# Altium footprint library MMT_MCUs_ICs.PcbLib: 44 footprints (part 3 of 3)
Each footprint in its own frame and in the unit in brackets; x right, y up, seen from the top. Pads: shape width x height; smd on the part's side, far side on the other; paste and mask are expansions set on the pad; w line width, h text height; cw(c..) or ccw(c..) is an arc to the next point about the centre after c.
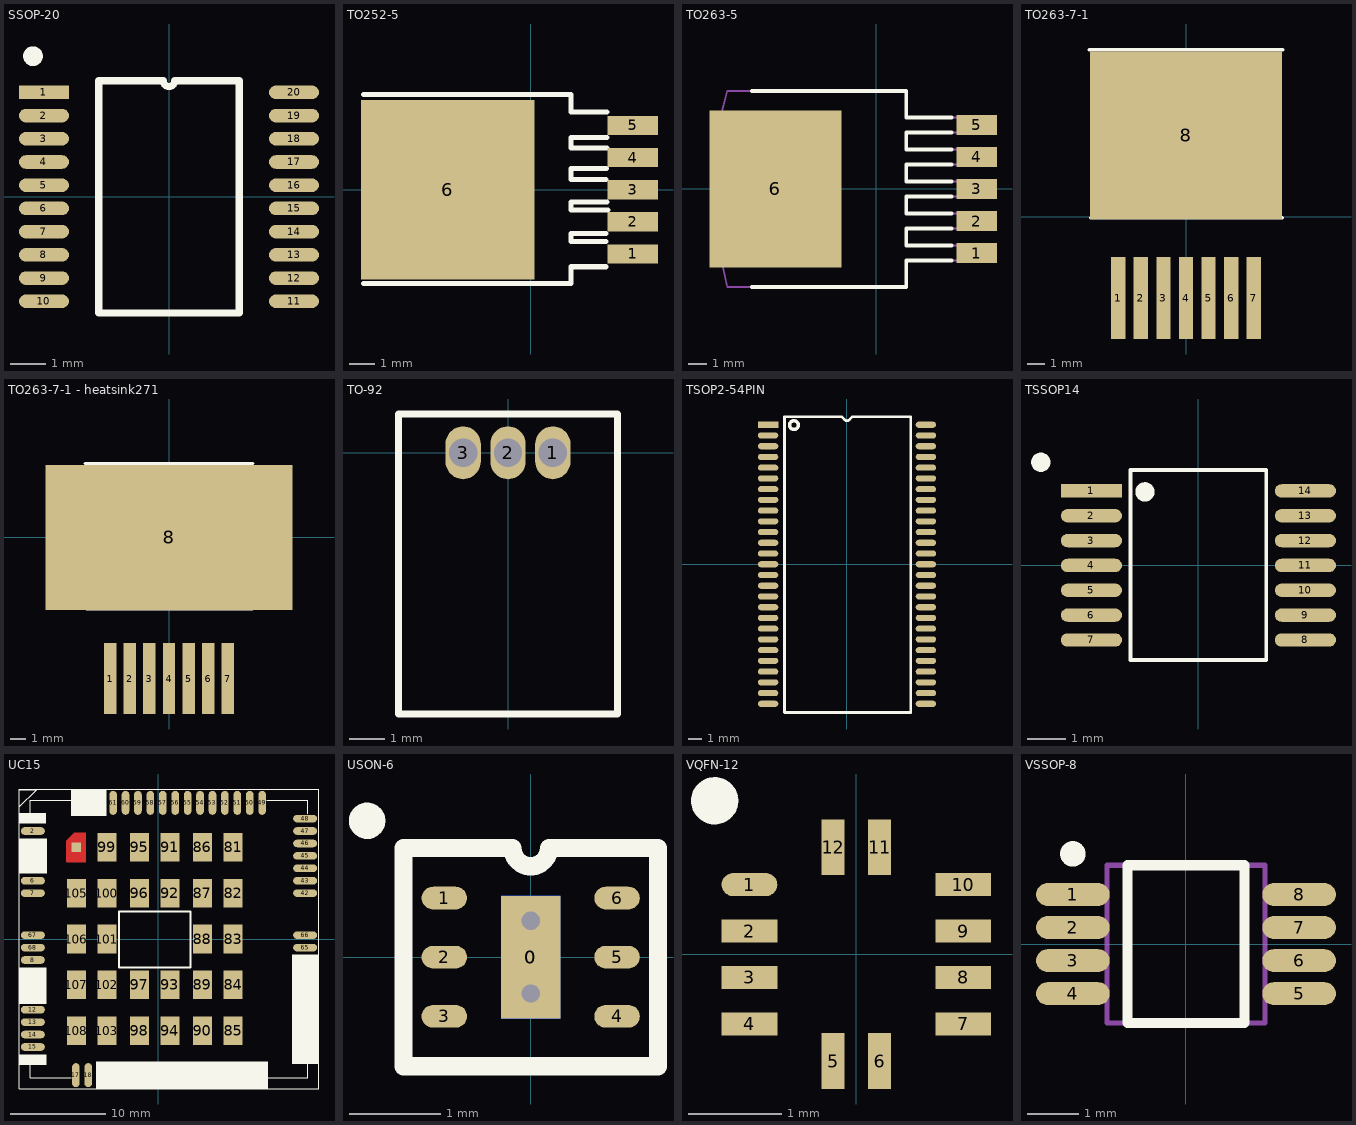
[diagram p2: the footprints below, top view; thin cyan lines are the x and y axes]

## SSOP-20 [mm]
pads (20):
  rect 1.4x0.38 smd: 1(-3.5,2.925)
  oval 1.4x0.38 smd: 2(-3.5,2.275) 3(-3.5,1.625) 4(-3.5,0.975) 5(-3.5,0.325) 6(-3.5,-0.325) 7(-3.5,-0.975) 8(-3.5,-1.625) 9(-3.5,-2.275) 10(-3.5,-2.925) 11(3.5,-2.925) 12(3.5,-2.275) 13(3.5,-1.625) 14(3.5,-0.975) 15(3.5,-0.325) 16(3.5,0.325) 17(3.5,0.975) 18(3.5,1.625) 19(3.5,2.275) 20(3.5,2.925)
Top Overlay:
  circle w0.3: c-3.81,3.937 r0.125
  lines w0.2: -1.965,-3.25 -1.965,3.25 -0.162,3.25 ccw(c0,3.25) 0.162,3.25 1.965,3.25 1.965,-3.25 -1.965,-3.25
3D body "User Library-SSOP 20 PIN-1 (1).step": height 1.98, standoff -0.01, extent -3.95,-3.665 3.95,3.665

## TO252-5 [mm]
pads (6):
  rect 2x0.76 smd: 1(4.035,-2.54) 2(4.035,-1.27) 3(4.035,0) 4(4.035,1.27) 5(4.035,2.54)
  rect 6.85x7.1 smd: 6(-3.277,0)
Top Overlay:
  lines w0.2: -6.6,-3.708 1.6,-3.708 1.6,-3.048 2.972,-3.048 ; -6.6,3.759 1.6,3.759 1.6,3.073 3.023,3.073 ; 2.972,-2.057 1.6,-2.057 1.6,-1.727 2.972,-1.727 ; 2.972,0.406 1.6,0.406 1.6,0.838 2.997,0.838 ; 3.023,-0.483 1.6,-0.483 1.6,-0.813 3.048,-0.813 ; 3.023,1.651 1.6,1.651 1.6,2.057 3.023,2.057
3D body "User Library-DPAK-5-1.STEP": height 2.4, standoff -0.01, extent -6.274,-3.299 4.592,3.401

## TO263-5 [mm]
pads (6):
  rect 2.16x1.07 smd: 1(5.338,-3.4) 2(5.338,-1.7) 3(5.338,0.005) 4(5.338,1.7) 5(5.338,3.4)
  rect 6.99x8.33 smd: 6(-5.338,0)
Top Overlay:
  lines w0.2: -6.6,-5.2 1.6,-5.2 1.6,-3.8 4,-3.8 ; -6.6,5.2 1.6,5.2 1.6,3.8 4,3.8 ; 4,-3 1.6,-3 1.6,-2.1 4,-2.1 ; 4,-1.3 1.6,-1.3 1.6,-0.4 4,-0.4 ; 4,0.4 1.6,0.4 1.6,1.3 4,1.3 ; 4,2.1 1.6,2.1 1.6,3 4,3
Mechanical 1:
  lines w0.1: -8.3,-3.3 -7.9,-5.2 1.6,-5.2 1.6,-3.8 6,-3.8 6,-3 1.6,-3 1.6,-2.1 6,-2.1 6,-1.3 1.6,-1.3 1.6,-0.4 6,-0.4 6,0.4 1.6,0.4 1.6,1.3 6,1.3 6,2.1 1.6,2.1 1.6,3 6,3 6,3.8 1.6,3.8 1.6,5.2 -7.9,5.2 -8.3,3.6 -8.3,-3.3
3D body "3d.stp": height 4.57, standoff -0.15, extent -8.039,-5.08 6.261,5.08

## TO263-7-1 [mm]
pads (8):
  rect 0.8x4.6 smd: 1(-3.81,-4.575) 2(-2.54,-4.575) 3(-1.27,-4.575) 4(0,-4.575) 5(1.27,-4.575) 6(2.54,-4.575) 7(3.81,-4.575)
  rect 10.8x9.4 smd: 8(0,4.575)
Top Overlay:
  lines w0.203: -5.436,9.376 5.436,9.376 ; -5.359,-0.073 5.41,-0.073
3D body "User Library-TO263-7-1.STEP": height 4.96, standoff 0.16, extent -5.022,-6.359 4.978,9.311

## TO263-7-1 - heatsink271 [mm]
pads (8):
  rect 0.8x4.6 smd: 1(-3.81,-9.15) 2(-2.54,-9.15) 3(-1.27,-9.15) 4(0,-9.15) 5(1.27,-9.15) 6(2.54,-9.15) 7(3.81,-9.15)
  rect 16x9.4 smd: 8(0,0)
Top Overlay:
  lines w0.203: -5.436,4.801 5.436,4.801 ; -5.359,-4.648 5.41,-4.648
3D body "User Library-TO263-7-1.STEP": height 4.96, standoff 0.16, extent -5.022,-10.934 4.978,4.736
3D body "v-1101-smd_a-l.stp": height 9.69, standoff 0.17, extent -7.495,-12.01 7.495,13.9

## TO-92 [mm] "TO-92"
height 5.08
pads (3):
  oval 1x1.5 hole 0.8: 1(1.27,0) 2(0,0) 3(-1.27,0)
Top Overlay:
  lines w0.2: -3.1,-7.4 3.1,-7.4 3.1,1.1 -3.1,1.1 -3.1,-7.4
3D body "User Library-TO-92-katowy.step": height 3.5, standoff -2, extent -2.846,-7.2 2.846,0.303

## TSOP2-54PIN [mm]
pads (54):
  rect 1.52x0.458 smd: 1(-5.88,10.4)
  oval 1.52x0.458 smd: 2(-5.88,9.6) 3(-5.88,8.8) 4(-5.88,8) 5(-5.88,7.2) 6(-5.88,6.4) 7(-5.88,5.6) 8(-5.88,4.8) 9(-5.88,4) 10(-5.88,3.2) 11(-5.88,2.4) 12(-5.88,1.6) 13(-5.88,0.8) 14(-5.88,0) 15(-5.88,-0.8) 16(-5.88,-1.6) 17(-5.88,-2.4) 18(-5.88,-3.2) 19(-5.88,-4) 20(-5.88,-4.8) 21(-5.88,-5.6) 22(-5.88,-6.4) 23(-5.88,-7.2) 24(-5.88,-8) 25(-5.88,-8.8) 26(-5.88,-9.6) 27(-5.88,-10.4) 28(5.88,-10.4) 29(5.88,-9.6) 30(5.88,-8.8) 31(5.88,-8) 32(5.88,-7.2) 33(5.88,-6.4) 34(5.88,-5.6) 35(5.88,-4.8) 36(5.88,-4) 37(5.88,-3.2) 38(5.88,-2.4) 39(5.88,-1.6) 40(5.88,-0.8) 41(5.88,0) 42(5.88,0.8) 43(5.88,1.6) 44(5.88,2.4) 45(5.88,3.2) 46(5.88,4) 47(5.88,4.8) 48(5.88,5.6) 49(5.88,6.4) 50(5.88,7.2) 51(5.88,8) 52(5.88,8.8) 53(5.88,9.6) 54(5.88,10.4)
Top Overlay:
  circle w0.254: c-3.955,10.375 r0.326
  lines w0.2: -4.655,-11.05 -4.655,11 -0.4,11 -0.2,10.8 ccw(c0,10.95) 0.2,10.8 0.4,11 4.745,11 4.745,-11.05 -4.655,-11.05
3D body "User Library-TSOP2-54.STEP": height 1.3, standoff -0.4, extent -5.88,-11.11 5.88,11.11

## TSSOP14 [mm]
pads (14):
  rect 1.6x0.35 smd: 1(-2.8,1.95)
  oval 1.6x0.35 smd: 2(-2.8,1.3) 3(-2.8,0.65) 4(-2.8,0) 5(-2.8,-0.65) 6(-2.8,-1.3) 7(-2.8,-1.95) 8(2.8,-1.95) 9(2.8,-1.3) 10(2.8,-0.65) 11(2.8,0) 12(2.8,0.65) 13(2.8,1.3) 14(2.8,1.95)
Top Overlay:
  circle w0.254: c-1.4,1.925 r0.125
  circle w0.254: c-4.125,2.7 r0.125
  lines w0.1: -1.775,-2.475 -1.775,2.5 1.775,2.5 1.775,-2.475 -1.775,-2.475
3D body "User Library-TSSOP14-1.step": height 1.1, standoff 0, extent -3.175,-2.5 3.225,2.5

## UC15 [mm]
pads (74):
  oval 2.5x0.8 smd: 2(-13.107,11.3) 6(-13.107,6.1) 7(-13.107,4.8) 8(-13.107,-2.2) 12(-13.107,-7.4) 13(-13.107,-8.7) 14(-13.107,-10) 15(-13.107,-11.3) 42(15.393,4.8) 43(15.393,6.1) 44(15.393,7.4) 45(15.393,8.7) 46(15.393,10) 47(15.393,11.3) 48(15.393,12.6) 65(15.393,-0.9) 66(15.393,0.4) 67(-13.107,0.4) 68(-13.107,-0.9)
  oval 0.8x2.5 smd: 17(-8.607,-14.25) 18(-7.307,-14.25) 49(10.893,14.25) 50(9.593,14.25) 51(8.293,14.25) 52(6.993,14.25) 53(5.693,14.25) 54(4.393,14.25) 55(3.093,14.25) 56(1.793,14.25) 57(0.493,14.25) 58(-0.807,14.25) 59(-2.107,14.25) 60(-3.407,14.25) 61(-4.707,14.25)
  rect 0x0 smd: 69(2.043,1.6) 70(2.043,0) 71(2.043,-1.6) 72(0.443,1.6) 73(0.443,0) 74(0.443,-1.6) 75(-1.157,1.6) 76(-1.157,0) 77(-1.157,-1.6) 78(-2.757,1.6) 79(-2.757,0) 80(-2.757,-1.6)
  rect 2x3 smd: 81(7.843,9.6) 82(7.843,4.8) 83(7.843,0) 84(7.843,-4.8) 85(7.843,-9.6) 86(4.643,9.6) 87(4.643,4.8) 88(4.643,0) 89(4.643,-4.8) 90(4.643,-9.6) 91(1.243,9.6) 92(1.243,4.8) 93(1.243,-4.8) 94(1.243,-9.6) 95(-1.957,9.6) 96(-1.957,4.8) 97(-1.957,-4.8) 98(-1.957,-9.6) 99(-5.357,9.6) 100(-5.357,4.8) 101(-5.357,0) 102(-5.357,-4.8) 103(-5.357,-9.6) 105(-8.557,4.8) 106(-8.557,0) 107(-8.557,-4.8) 108(-8.557,-9.6)
  rect 1x1 smd: 104(-8.557,9.6)
Top Layer:
  region: -9.551,10.262 -9.551,8.128 -8.662,8.128 -8.662,10.262
  region: -8.738,11.074 -8.738,8.103 -7.57,8.103 -7.57,11.074
  region: -9.096,9.801 -8.268,10.63 -8.738,11.1 -9.566,10.271
  lines w0.102: -9.557,8.1 -8.557,8.1 -7.957,8.1 -7.557,8.1 -7.557,9.6 -7.557,11.1 -8.732,11.1 -9.557,10.275 -9.557,8.1
Top Overlay:
  region: -11.707,13.2 -14.514,13.2 -14.514,12.1 -11.707,12.1
  rectangle: -9.1,12.9 -5.4,15.7
  rectangle: 14,-13.1 16.8,-1.6
  rectangle: -6.499,-15.7 11.501,-12.8
  rectangle: -14.507,-13.2 -11.7,-12.1
  rectangle: -14.5,-6.8 -11.7,-3
  rectangle: -14.501,6.858 -11.601,10.5
  lines w0.1: -13.357,-12.2 -13.357,-14.5 -9.1,-14.5 ; -13.357,13.1 -13.357,14.5 -6.107,14.5 -5.807,14.2 ; -5.707,-13.7 -5.507,-13.9 ; 7.793,-13.9 8.393,-14.5 15.643,-14.5 15.643,-7.25 14.8,-6.407 ; 11.4,14.5 15.643,14.5 15.643,13.1 ; -14.507,-15.65 -14.507,15.65 16.793,15.65 16.793,-15.65 -14.507,-15.65 ; -14.507,13.865 -14.507,15.625 -12.722,15.625 -14.507,13.865
  lines w0.203: -4.1,-3 3.4,-3 3.4,2.9 -4.1,2.9 -4.1,-3
Top Paste:
  region: -9.097,9.8 -8.268,10.63 -8.742,11.104 -9.572,10.274
  region: -9.525,10.262 -9.525,8.103 -8.687,8.103 -8.687,10.262
  region: -8.738,11.074 -8.738,8.103 -7.595,8.103 -7.595,11.074
  lines w0.102: -9.557,8.1 -7.557,8.1 -7.557,11.1 -8.732,11.1 -9.557,10.275 -9.557,8.1
Top Solder:
  region: -8.814,11.125 -8.814,8.077 -7.544,8.077 -7.544,11.125
  region: -9.602,10.338 -9.602,8.077 -8.789,8.077 -8.789,10.338
  region: -9.18,9.921 -8.395,10.706 -8.812,11.123 -9.597,10.338
  lines w0.102: -9.607,8.05 -7.507,8.05 -7.507,11.15 -8.782,11.15 -9.607,10.325 -9.607,8.05

## USON-6 [mm]
pads (10):
  rect 0x0 hole 0.2: 0(0,-0.4) 0(0,0.4)
  rect 0.65x1.35 smd: 0(0,0)
  rect 0.65x1.35 smd far side: 0(0,0)
  oval 0.5x0.25 smd: 1(-0.95,0.65) 2(-0.95,0) 3(-0.95,-0.65) 4(0.95,-0.65) 5(0.95,0) 6(0.95,0.65)
Top Overlay:
  circle w0.2: c-1.8,1.5 r0.1
  lines w0.2: -1.4,-1.2 -1.4,1.2 -0.2,1.2 ccw(c0,1.2) 0.2,1.2 1.4,1.2 1.4,-1.2 -1.4,-1.2
3D body "User Library-USON6.step": height 0.6, standoff -0.05, extent -1,-1 1,1

## VQFN-12 [mm]
height 1
pads (12):
  oval 0.6x0.25 smd: 1(-1.15,0.75)
  rect 0.6x0.25 smd: 2(-1.15,0.25) 3(-1.15,-0.25) 4(-1.15,-0.75) 7(1.15,-0.75) 8(1.15,-0.25) 9(1.15,0.25) 10(1.15,0.75)
  rect 0.25x0.6 smd: 5(-0.25,-1.15) 6(0.25,-1.15) 11(0.25,1.15) 12(-0.25,1.15)
Top Overlay:
  circle w0.254: c-1.524,1.651 r0.127
3D body "User Library-VQFN-12.step": height 0.95, standoff -0.05, extent -1.26,-1.26 1.26,1.26

## VSSOP-8 [mm] "TSOP, 8-Leads, Body 3.00x3.00mm, Pitch 0.65mm, IPC Medium Density"
height 1.1
pads (8):
  oval 1.45x0.45 smd: 1(-2.225,0.975) 2(-2.225,0.325) 3(-2.225,-0.325) 4(-2.225,-0.975) 5(2.225,-0.975) 6(2.225,-0.325) 7(2.225,0.325) 8(2.225,0.975)
Top Overlay:
  circle w0.25: c-2.225,1.775 r0.125
  lines w0.2: -1.15,-1.55 -1.15,1.55 1.15,1.55 1.15,-1.55 -1.15,-1.55
Mechanical 13:
  lines w0.1: -1.55,-1.55 -1.55,1.55 1.55,1.55 1.55,-1.55 -1.55,-1.55
3D body "VSSOP-8-LMP7716.step": height 1.1, standoff 0, extent -2.45,-1.55 2.45,1.55